# Altium footprint library Tienanh.PcbLib: 190 footprints (part 3 of 12)
Each footprint in its own frame and in the unit in brackets; x right, y up, seen from the top. Pads: shape width x height; smd on the part's side, far side on the other; paste and mask are expansions set on the pad; w line width, h text height; cw(c..) or ccw(c..) is an arc to the next point about the centre after c.
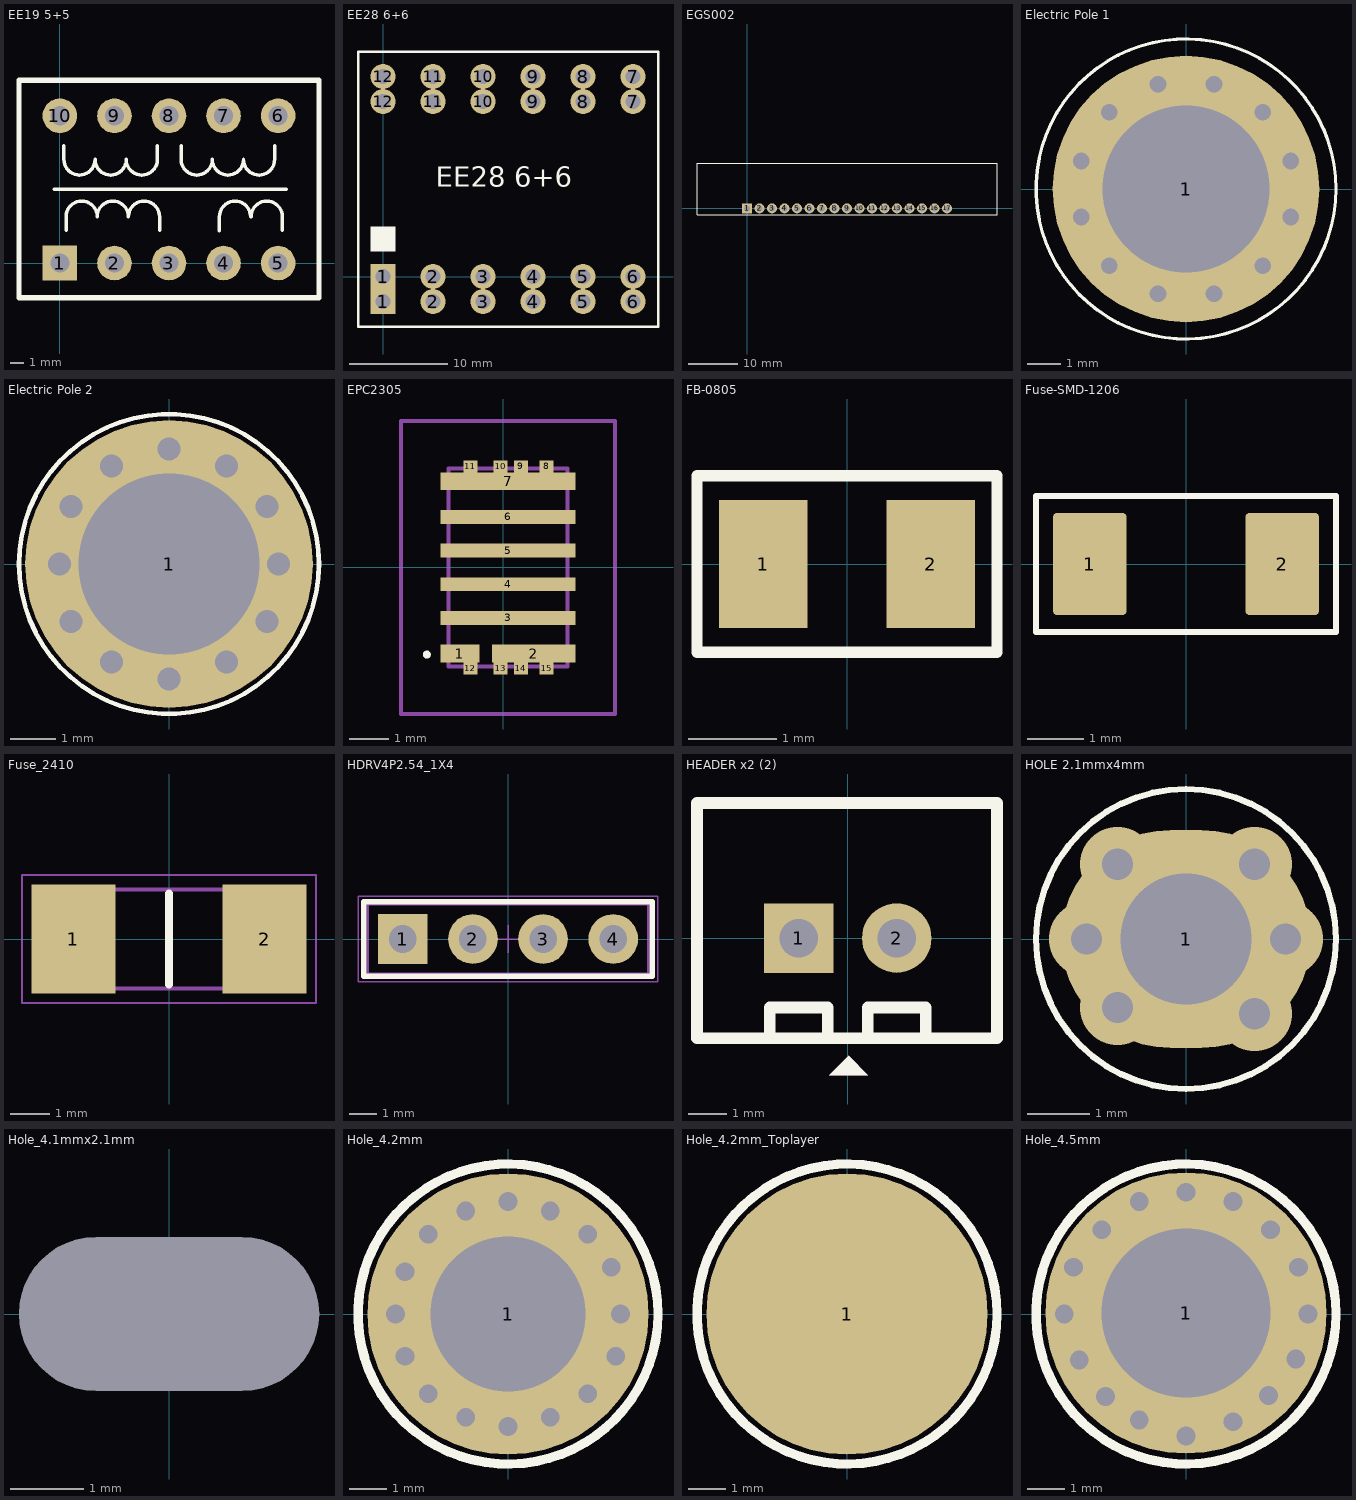
[diagram p2: the footprints below, top view; thin cyan lines are the x and y axes]

## EE19 5+5 [mm] "5+5 pin"
pads (10):
  rect 2.54x2.54 hole 1.397: 1(0,0)
  round 2.54 hole 1.397: 2(4,0) 3(8,0) 4(12,0) 5(16,0) 6(16,10.8) 7(12,10.8) 8(8,10.8) 9(4,10.8) 10(0,10.8)
Top Overlay:
  lines w0.254: -0.4,5.4 16.6,5.4 ; 0.291,8.614 0.291,7.598 ccw(c1.434,7.598) 2.577,7.598 ccw(c3.72,7.598) 4.863,7.598 ccw(c6.006,7.598) 7.149,7.598 7.149,8.614 ; 0.451,2.386 0.451,3.402 cw(c1.594,3.402) 2.737,3.402 cw(c3.88,3.402) 5.023,3.402 cw(c6.166,3.402) 7.309,3.402 7.309,2.386 ; 8.891,8.614 8.891,7.598 ccw(c10.034,7.598) 11.177,7.598 ccw(c12.32,7.598) 13.463,7.598 ccw(c14.606,7.598) 15.749,7.598 15.749,8.614 ; 11.7,2.384 11.7,3.4 cw(c12.843,3.4) 13.986,3.4 ; 14.023,3.402 cw(c15.166,3.402) 16.309,3.402 16.309,2.386
  lines w0.381: -3,-2.54 19,-2.54 19,13.4 12.71,13.4 2.85,13.4 -3,13.4 -3,-2.54

## EE28 6+6 [mm] "EC28 12 PIN Vertical"
pads (24):
  rect 2.54x2.54 hole 1.5: 1(0,-2.54) 1(0,0)
  round 2.54 hole 1.5: 2(5.08,-2.54) 2(5.08,0) 3(10.16,-2.54) 3(10.16,0) 4(15.24,-2.54) 4(15.24,0) 5(20.32,-2.54) 5(20.32,0) 6(25.4,-2.54) 6(25.4,0) 7(25.4,17.78) 7(25.4,20.32) 8(20.32,17.78) 8(20.32,20.32) 9(15.24,17.78) 9(15.24,20.32) 10(10.16,17.78) 10(10.16,20.32) 11(5.08,17.78) 11(5.08,20.32) 12(0,17.78) 12(0,20.32)
Top Overlay:
  rectangle: -1.27,2.54 1.27,5.08
  lines w0.254: -2.54,-5.08 27.94,-5.08 27.94,22.86 -2.54,22.86 -2.54,-5.08
  text "EE28 6+6" at 5.334,9.144 h2.03
3D body "eer28 6+6.step": height 36.88, standoff -3.68, extent -1.55,-4.11 26.95,21.89

## EGS002 [mil]
pads (17):
  rect 80x80 hole 50: 1(0,0)
  round 80 hole 50: 2(100,0) 3(200,0) 4(300,0) 5(400,0) 6(500,0) 7(600,0) 8(700,0) 9(800,0) 10(900,0) 11(1000,0) 12(1100,0) 13(1200,0) 14(1300,0) 15(1400,0) 16(1500,0) 17(1600,0)
Top Overlay:
  lines w10: -400,-50 2000,-50 2000,360 -400,360 -400,-50
3D body "ESG002.stp": height 1274.84, standoff -177.13, extent -400,-10 2001.58,359.68

## Electric Pole 1 [mm]
pads (1):
  round 8 hole 5: 1(0,0)
via 0.841,3.139 diameter 1.4 hole 0.5
via 2.298,2.298 diameter 1.4 hole 0.5
via -0.841,3.139 diameter 1.4 hole 0.5
via 3.139,0.841 diameter 1.4 hole 0.5
via 3.139,-0.841 diameter 1.4 hole 0.5
via 2.298,-2.298 diameter 1.4 hole 0.5
via 0.841,-3.139 diameter 1.4 hole 0.5
via -0.841,-3.139 diameter 1.4 hole 0.5
via -2.298,-2.298 diameter 1.4 hole 0.5
via -3.139,-0.841 diameter 1.4 hole 0.5
via -3.139,0.841 diameter 1.4 hole 0.5
via -2.298,2.298 diameter 1.4 hole 0.5
Top Overlay:
  circle w0.1: c0,0 r4.5
3D body "MCL2.3-02.01.STEP": height 28, standoff -3, extent -4,-4 4,4

## Electric Pole 2 [mm]
pads (1):
  round 6.35 hole 4 mask+0: 1(0,0)
via -2.159,1.27 diameter 0.762 hole 0.508
via -2.413,0 diameter 0.762 hole 0.508
via -2.159,-1.27 diameter 0.762 hole 0.508
via -1.27,-2.159 diameter 0.762 hole 0.508
via 0,-2.54 diameter 0.762 hole 0.508
via 1.27,-2.159 diameter 0.762 hole 0.508
via 2.159,-1.27 diameter 0.762 hole 0.508
via 2.413,0 diameter 0.762 hole 0.508
via 2.159,1.27 diameter 0.762 hole 0.508
via 1.27,2.159 diameter 0.762 hole 0.508
via 0,2.54 diameter 0.762 hole 0.508
via -1.27,2.159 diameter 0.762 hole 0.508
Top Overlay:
  circle w0.1: c0,0 r3.312
3D body: height 0, standoff 0, extent -3.362,-3.362 3.362,3.362

## EPC2305 [mm]
pads (15):
  rect 0.975x0.45 smd: 1(-1.094,-2.175)
  rect 2.11x0.45 smd: 2(0.764,-2.175)
  rect 3.4x0.35 smd: 3(0.119,-1.275) 4(0.119,-0.425) 5(0.119,0.425) 6(0.119,1.275)
  rect 3.4x0.45 smd: 7(0.119,2.175)
  rect 0.35x0.3 smd: 8(1.094,2.55) 9(0.444,2.55) 10(-0.066,2.55) 11(-0.831,2.55) 12(-0.831,-2.55) 13(-0.066,-2.55) 14(0.444,-2.55) 15(1.094,-2.55)
Top Overlay:
  lines w0.1: -1.981,-2.2 ccw(c-1.931,-2.2) -1.881,-2.2 ccw(c-1.931,-2.2) -1.981,-2.2
Mechanical 13:
  lines w0.1: -1.381,-2.5 -1.381,2.5 1.619,2.5 1.619,-2.5 -1.381,-2.5
Mechanical 15:
  lines w0.1: -2.581,-3.7 -2.581,3.7 2.819,3.7 2.819,-3.7 -2.581,-3.7
3D body "EPC2305 3D CAD.stp": height 0.8, standoff 0.05, extent -1.373,-2.489 1.627,2.511

## FB-0805 [mm]
pads (2):
  rect 1x1.45 smd: 1(-0.95,0) 2(0.95,0)
Top Overlay:
  lines w0.127: -1.7,-1 -1.7,1 1.7,1 1.7,-1 -1.7,-1
3D body "L0805.step": height 0.8, standoff 0, extent -1,-0.6 1,0.6

## Fuse-SMD-1206 [mm]
pads (2):
  rrect10% 1.3x1.8 smd mask+0.07: 1(-1.7,0) 2(1.7,0)
Top Overlay:
  lines w0.1: -2.65,-1.2 2.65,-1.2 2.65,1.2 -2.65,1.2 -2.65,-1.2
Top Assembly:
  lines w0.1: -2.65,-1.2 2.65,-1.2 2.65,1.2 -2.65,1.2 -2.65,-1.2
3D body "fuse_silicon_1206L.step": height 0.5, standoff 0, extent -1.75,-0.92 1.75,0.92

## Fuse_2410 [mm]
pads (2):
  rect 2.15x2.8 smd: 1(-2.455,0) 2(2.455,0)
Top Overlay:
  lines w0.2: 0,-1.17 0,1.17
Mechanical 13:
  lines w0.1: -3.05,-1.27 3.05,-1.27 3.05,1.27 -3.05,1.27 -3.05,-1.27
Mechanical 15:
  lines w0.05: -3.78,-1.65 3.78,-1.65 3.78,1.65 -3.78,1.65 -3.78,-1.65
3D body "0679L1000-01.stp": height 2.79, standoff 0, extent -3.05,-1.27 3.05,1.27

## HDRV4P2.54_1X4 [mm]
pads (4):
  rect 1.8x1.8 hole 1 mask+0.075: 1(-3.81,0)
  round 1.8 hole 1 mask+0.075: 2(-1.27,0) 3(1.27,0) 4(3.81,0)
Top Overlay:
  lines w0.2: -5.23,-1.345 -5.23,1.345 5.23,1.345 5.23,-1.345 -5.23,-1.345
Top Assembly:
  lines w0.1: -5.08,-1.27 5.08,-1.27 5.08,1.27 -5.08,1.27 -5.08,-1.27
  text ".Designator" at -4.376,-0.428 h1.2
Top Courtyard:
  lines w0.05: -0.5,0 0.5,0 ; 0,-0.5 0,0.5 ; -5.43,-1.545 5.43,-1.545 5.43,1.545 -5.43,1.545 -5.43,-1.545
Top Value:
  text ".Value" at -2.165,-0.6 h1.2
3D body "61300411121.stp": height 8.57, standoff -2.97, extent -5.08,-1.27 5.08,1.27

## HEADER x2 (2) [mm]
height 2.4
pads (2):
  rect 1.8x1.8 hole 1 mask+0.1: 1(-1.27,0)
  round 1.8 hole 1 mask+0.1: 2(1.27,0)
Top Overlay:
  region: -0.48,-3.55 0.02,-3.05 0.52,-3.55
  lines w0.3: -2.02,-2.5 -2.02,-1.8 -0.52,-1.8 -0.52,-2.5 ; 0.52,-2.5 0.52,-1.8 2.02,-1.8 2.02,-2.5 ; -3.91,-2.596 -3.91,3.504 3.87,3.504 3.87,-2.596 -3.91,-2.596
Mechanical 1:
  circle w0.05: c-1.27,0 r0.762
  circle w0.05: c1.27,0 r0.762
  region: -0.48,-3.55 0.02,-3.05 0.52,-3.55
  lines w0.05: -2.02,-2.596 -2.02,-1.8 -0.52,-1.8 -0.52,-2.596 ; 0.52,-2.596 0.52,-1.8 2.02,-1.8 2.02,-2.596 ; -3.91,-2.596 -3.91,3.504 3.87,3.504 3.87,-2.596 -3.91,-2.596
  text "1" at -1.43,-0.4 h0.8
  text "2" at 0.97,-0.4 h0.8
3D body "JST2a.step": height 7, standoff -3.4, extent -3.73,-2.4 3.67,3.35

## HOLE 2.1mmx4mm [mm]
pads (1):
  oval 4x3.5 hole 2.1 mask+0: 1(0,0)
via -1.1,1.2 diameter 1.2 hole 0.5
via -1.1,-1.1 diameter 1.2 hole 0.5
via 1.1,-1.2 diameter 1.2 hole 0.5
via 1.1,1.2 diameter 1.2 hole 0.5
via 1.6,0 diameter 1.2 hole 0.5
via -1.6,0 diameter 1.2 hole 0.5
Top Overlay:
  circle w0.1: c0,0 r2.408

## Hole_4.1mmx2.1mm [mm]
pads (1):
  round 0 hole 2.1 slot 4.1 at 0 deg: 1(0,0)

## Hole_4.2mm [mil]
pads (1):
  round 300 hole 165 mask+0: 1(0,0)
via -110,-45 diameter 30 hole 20
via -85,-85 diameter 30 hole 20
via -45,-110 diameter 30 hole 20
via 85,-85 diameter 30 hole 20
via 115,-45 diameter 30 hole 20
via 45,-110 diameter 30 hole 20
via 45,110 diameter 30 hole 20
via 85,85 diameter 30 hole 20
via 110,50 diameter 30 hole 20
via -110,45 diameter 30 hole 20
via -85,85 diameter 30 hole 20
via -45,110 diameter 30 hole 20
via -120,0 diameter 30 hole 20
via 0,-120 diameter 30 hole 20
via 0,120 diameter 30 hole 20
via 120,0 diameter 30 hole 20
Top Overlay:
  circle w10: c0,0 r160

## Hole_4.2mm_Toplayer [mm]
pads (1):
  round 7.62 smd mask+0: 1(0,0)
Top Overlay:
  circle w0.254: c0,0 r4.064
3D body "coc dong.stp": height 10, standoff 0, extent -3,-3 3,3

## Hole_4.5mm [mil]
pads (1):
  round 300 hole 180 mask+0: 1(0,1)
via -114,-49 diameter 30 hole 20
via -86,-88 diameter 30 hole 20
via -50,-113 diameter 30 hole 20
via 88,-87 diameter 30 hole 20
via 117,-48 diameter 30 hole 20
via 50,-115 diameter 30 hole 20
via 50,120 diameter 30 hole 20
via 90,90 diameter 30 hole 20
via 120,50 diameter 30 hole 20
via -120,50 diameter 30 hole 20
via -90,90 diameter 30 hole 20
via -50,120 diameter 30 hole 20
via -130,0 diameter 30 hole 20
via 0,-130 diameter 30 hole 20
via 0,130 diameter 30 hole 20
via 130,0 diameter 30 hole 20
Top Overlay:
  circle w10: c0,0 r160